# Altium footprint library MinervaBots.PcbLib: 162 footprints (part 5 of 11)
Each footprint in its own frame and in the unit in brackets; x right, y up, seen from the top. Pads: shape width x height; smd on the part's side, far side on the other; paste and mask are expansions set on the pad; w line width, h text height; cw(c..) or ccw(c..) is an arc to the next point about the centre after c.
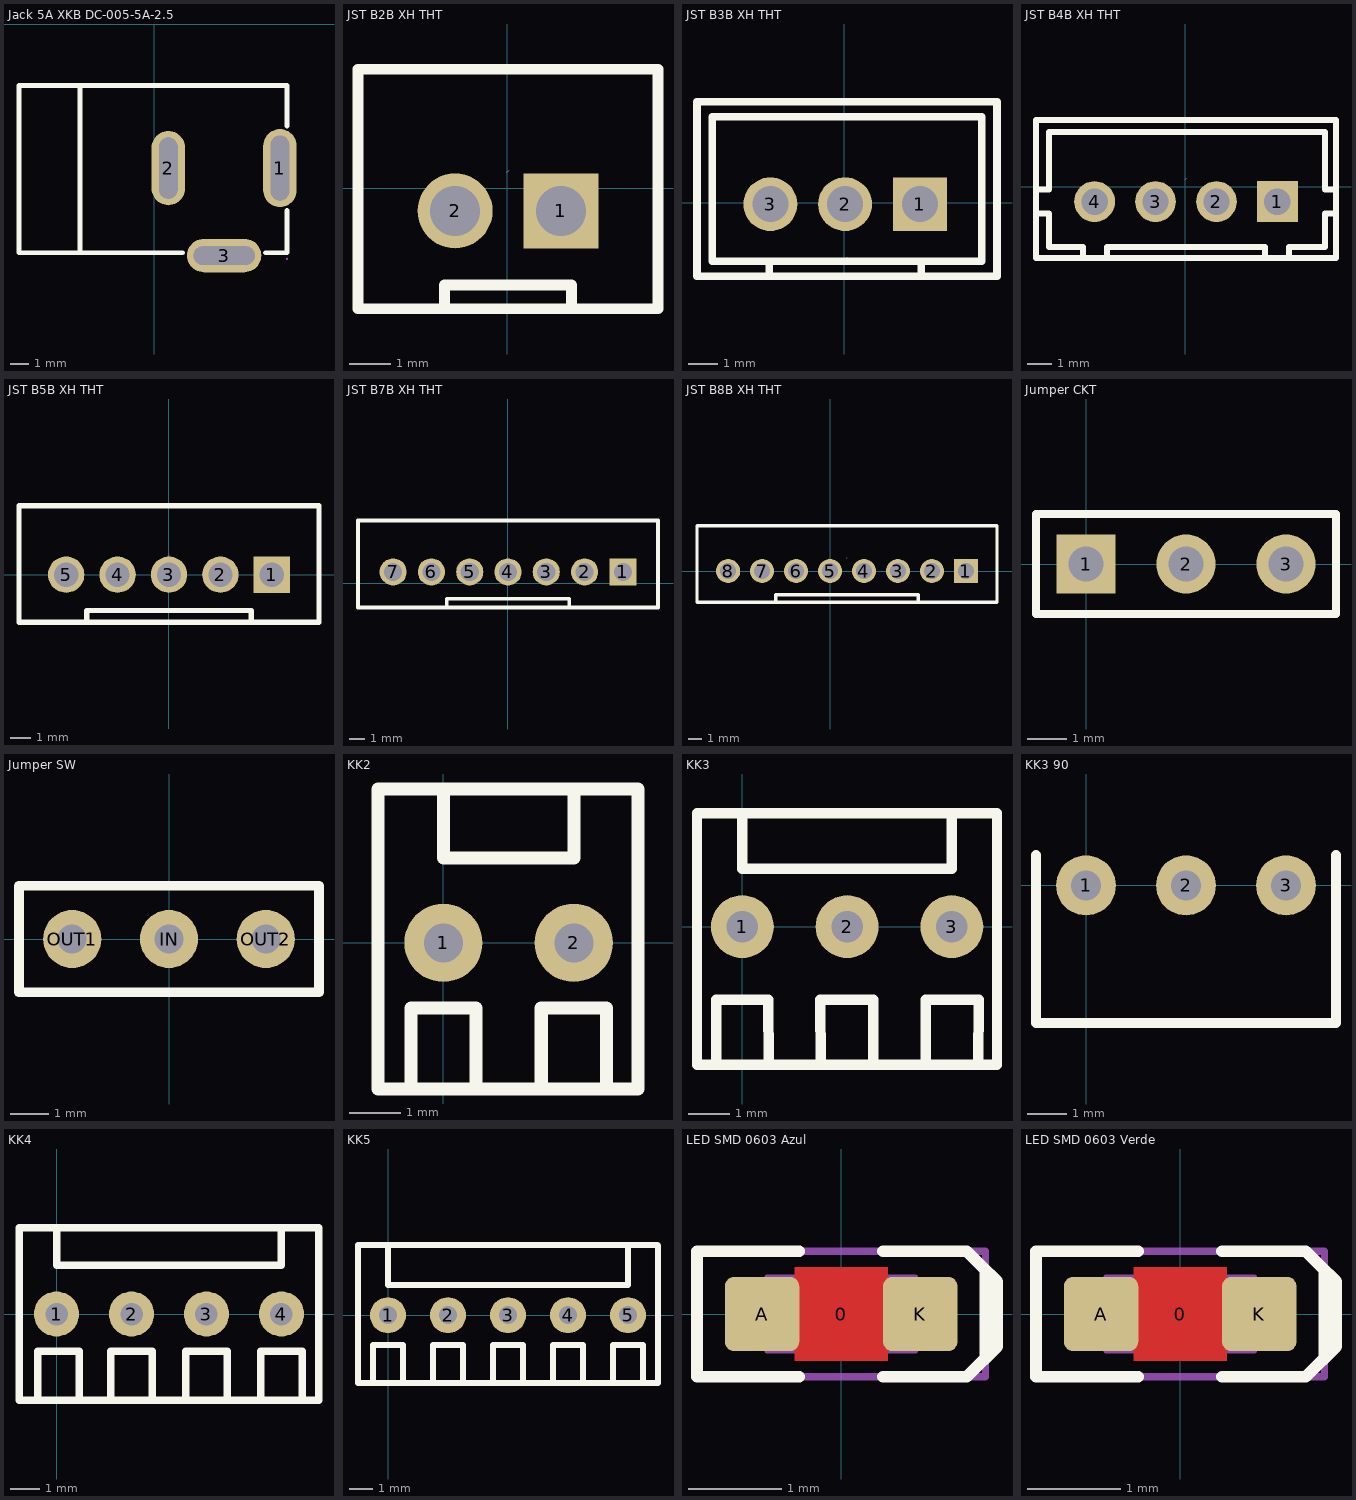
[diagram p4: the footprints below, top view; thin cyan lines are the x and y axes]

## Jack 5A XKB DC-005-5A-2.5 [mm] "Jack 5A XKB DC-005-5A-2.5"
pads (3):
  oval 1.8x4.2 hole 1 slot 3.5 at 90 deg: 1(6.764,-7.769)
  oval 1.8x4 hole 1 slot 3.3 at 90 deg: 2(0.764,-7.769)
  oval 4x1.8 hole 1 slot 3.3 at 0 deg: 3(3.763,-12.472)
Top Overlay:
  lines w0.254: -7.264,-3.324 7.144,-3.324 7.144,-5.504 ; -7.264,-3.316 -7.264,-12.316 1.543,-12.316 ; -3.984,-12.324 -3.984,-3.324 ; 5.984,-12.316 7.144,-12.316 7.144,-10.034
Top Designator:
  text ".Designator" at -7.431,-8.792 h1.52
Mechanical 5:
  region: 2.513,-12.297 5.013,-12.297 5.013,-12.647 2.513,-12.647
  region: 0.589,-9.019 0.589,-6.519 0.939,-6.519 0.939,-9.019
  region: 6.939,-6.269 6.939,-9.269 6.589,-9.269 6.589,-6.269
Mechanical 6:
  circle w0.06: c7.144,-12.648 r0.03
Mechanical 15:
  lines w0.003: 0.536,-8.082 0.587,-8.031
3D body "DCJ200-10-A-K1-K--3DModel-STEP-56544.STEP": height 11, standoff -3.5, extent -7.029,-12.645 7.271,-3.095

## JST B2B XH THT [mm] "JST Conector, 2 ways"
pads (2):
  rect 1.8x1.8 hole 1.2: 1(1.289,-0.546)
  round 1.8 hole 1.2: 2(-1.251,-0.546)
Top Overlay:
  lines w0.254: -1.505,-2.832 -1.505,-2.324 1.543,-2.324 1.543,-2.832 1.543,-2.578 ; -3.581,-2.896 -3.581,2.854 3.619,2.854 3.619,-2.896 -3.581,-2.896
Top Designator:
  text ".Designator" at -7.62,-0.528 h1.52
Mechanical 15:
  lines w0.003: -0.007,0.381 0.044,0.432
3D body "User Library-JST B2B-XH-A.step": height 7.1, standoff -3.3, extent -3.751,-2.931 3.649,2.819

## JST B3B XH THT [mm] "Jst conector, 3 ways"
pads (3):
  rect 1.8x1.8 hole 1.2: 1(2.526,-0.051)
  round 1.8 hole 1.2: 2(0.025,-0.051) 3(-2.474,-0.051)
Top Overlay:
  lines w0.254: -2.515,-2.464 -2.515,-2.083 ; 2.565,-2.464 2.565,-1.956 ; -4.928,-2.464 5.105,-2.464 5.105,3.378 -4.928,3.378 -4.928,-2.464 ; -4.42,-1.956 4.597,-1.956 4.597,2.87 -4.42,2.87 -4.42,-1.956
Top Designator:
  text ".Designator" at -7.529,-0.051 h1.52
Mechanical 15:
  lines w0.003: 0.064,-1.873 0.114,-1.822
3D body "User Library-jst-b3b-xh-a.step": height 7.1, standoff -3.3, extent -4.95,-2.367 4.95,3.383

## JST B4B XH THT [mm] "JST Conector, 4 ways"
pads (4):
  rect 1.7x1.7 hole 1.1: 1(3.837,-0.622)
  round 1.7 hole 1.1: 2(1.297,-0.622) 3(-1.243,-0.622) 4(-3.783,-0.622)
Top Overlay:
  lines w0.254: -6.173,-1.122 -5.673,-1.122 -5.673,-2.522 -4.273,-2.522 -4.273,-2.922 ; -6.173,-0.122 -5.673,-0.122 -5.673,2.278 5.827,2.278 5.827,-0.122 6.227,-0.122 ; -3.273,-2.922 -3.273,-2.522 3.327,-2.522 3.327,-2.922 ; 4.327,-2.922 4.327,-2.522 5.827,-2.522 5.827,-1.122 6.227,-1.122 ; -6.223,-2.972 6.277,-2.972 6.277,2.778 -6.223,2.778 -6.223,-2.972
Top Designator:
  text ".Designator" at -7.591,-0.605 h1.52
Mechanical 15:
  lines w0.003: 0.002,0.305 0.052,0.356
3D body "User Library-jst-b4b-xh-a-1.step": height 7.1, standoff -3.3, extent -6.225,-2.977 6.175,2.773

## JST B5B XH THT [mm] "JST conector, 5 ways"
pads (5):
  rect 1.8x1.8 hole 1.2: 1(5.08,0)
  round 1.8 hole 1.2: 2(2.54,0) 3(0,0) 4(-2.54,0) 5(-5.08,0)
Top Overlay:
  lines w0.254: -4.064,-2.286 -4.064,-1.778 4.064,-1.778 4.064,-2.286 ; -7.41,-2.35 7.41,-2.35 7.41,3.4 -7.41,3.4 -7.41,-2.35
Top Designator:
  text ".Designator" at -7.618,0.017 h1.52
Mechanical 15:
  lines w0.003: -0.025,0.927 0.025,0.978
3D body "User Library-jst-b4b-xh-a.step": height 7.1, standoff -3.3, extent -7.443,-2.424 7.457,3.326

## JST B7B XH THT [mm] "Jst conector, 7 ways"
pads (7):
  rect 1.8x1.8 hole 1.2: 1(7.639,0.75)
  round 1.8 hole 1.2: 2(5.099,0.75) 3(2.559,0.75) 4(0.019,0.75) 5(-2.521,0.75) 6(-5.061,0.75) 7(-7.601,0.75)
Top Overlay:
  lines w0.254: -4.045,-1.536 -4.045,-1.028 4.083,-1.028 4.083,-1.536 ; -9.931,-1.6 -9.931,4.15 9.969,4.15 9.969,-1.6 -9.931,-1.6
Top Designator:
  text ".Designator" at -7.599,0.767 h1.52
Mechanical 15:
  lines w0.003: -0.007,1.677 0.044,1.727
3D body "User Library-B7B-XH-A.step": height 7.2, standoff -3.2, extent -9.925,-1.61 9.975,4.14

## JST B8B XH THT [mm] "JST conector, 8 ways"
pads (8):
  rect 1.8x1.8 hole 1.2: 1(10.16,0)
  round 1.8 hole 1.2: 2(7.62,0) 3(5.08,0) 4(2.54,0) 5(0,0) 6(-2.54,0) 7(-5.08,0) 8(-7.62,0)
Top Overlay:
  lines w0.254: -4.064,-2.286 -4.064,-1.778 6.604,-1.778 6.604,-2.286 ; -9.95,-2.35 12.49,-2.35 12.49,3.4 -9.95,3.4 -9.95,-2.35
Top Designator:
  text ".Designator" at -6.348,0.017 h1.52
Mechanical 15:
  lines w0.003: 1.245,0.927 1.295,0.978
3D body "User Library-B8B-XH-A.STEP": height 7.1, standoff -3.3, extent -10.006,-2.397 12.394,3.353

## Jumper CKT [mm]
pads (3):
  rect 1.5x1.5 hole 0.9: 1(0,0)
  round 1.5 hole 0.9: 2(2.54,0) 3(5.08,0)
Top Overlay:
  lines w0.2: -1.27,-1.27 -1.27,1.27 6.35,1.27 6.35,-1.27 -1.27,-1.27
Top Designator:
  text ".Designator" at -5.078,-0.508 h1.52
3D body "Jumper.step": height 16.21, standoff 2.39, extent -1.2,-1.2 3.8,1.2
3D body "Header 3 pins - Male.stp": height 8.27, standoff -3.27, extent -1.27,-1.24 6.35,1.3

## Jumper SW [mil]
pads (3):
  round 60 hole 30: IN(0,0) OUT1(-100,0) OUT2(100,0)
Top Overlay:
  lines w10: -155,-55 155,-55 155,55 -155,55 -155,-55
Top Designator:
  text ".Designator" at -299.9,-19.99 h60
3D body "Jumper3.step": height 338.58, standoff -118.11, extent -152.36,-50 150,50

## KK2 [mil] "KK Conector, 2 ways"
pads (2):
  round 60 hole 30: 1(0,0) 2(100,0)
Top Overlay:
  lines w10: -25,-112 -25,-50 25,-50 25,-112 75,-112 75,-50 125,-50 125,-112 ; 0,118 0,65 100,65 100,118 ; -50,-112 149,-112 149,118 -50,118 -50,72 -50,-112
Top Designator:
  text ".Designator" at -250.4,-16.99 h60
3D body "KK2.STEP": height 467.5, standoff -132.5, extent -50,-116 150,114

## KK3 [mil] "KK connector, 3 ways"
pads (3):
  round 60 hole 30: 1(0,0) 2(100,0) 3(200,0)
Top Overlay:
  lines w10: -25,-131.89 -25,-69.88 24.54,-69.88 25,-131.89 ; 0,108.27 0,55.27 200,55.27 200,108.27 ; 74.8,-131.89 74.57,-69.88 124.8,-69.88 124.8,-131.89 ; 175,-131.89 175.23,-69.88 225.46,-69.88 225,-131.89 ; -43.31,-131.89 243.11,-131.89 243.11,108.27 -43.31,108.27 -43.31,-131.89
Top Designator:
  text ".Designator" at -200,-31.8 h60
3D body "22041031.STEP": height 462.6, standoff -131.89, extent -37.8,-125.98 237.8,102.36

## KK3 90 [mil] "KK connector, 3 ways, right-angle"
pads (3):
  round 60 hole 30: 1(0,0) 2(100,0) 3(200,0)
Top Overlay:
  lines w10: -50,30.51 -50,-137.6 250,-137.6 250,30.4
Top Designator:
  text ".Designator" at -199.9,107.52 h60
3D body "22051032.STEP": height 250.69, standoff -131.89, extent -37.8,-125.98 237.8,397.64

## KK4 [mil] "KK Conector, 4 ways"
pads (4):
  round 60 hole 30: 1(0,0) 2(100,0) 3(200,0) 4(300,0)
Top Overlay:
  lines w10: -25,-115 -25,-50 30,-50 30,-115 ; 0,110 0,65 300,65 300,115 ; 72.5,-115 72.5,-50 127.5,-50 127.5,-115 ; 172.5,-115 172.5,-50 227.5,-50 227.5,-115 ; 272.5,-115 272.5,-50 327.5,-50 327.5,-115 ; -50,-115 350,-115 350,115 -50,115 -50,-115
Top Designator:
  text ".Designator" at -149.9,-19.99 h60
3D body "KK4.STEP": height 467.5, standoff -132.5, extent -49.99,-116.99 350.01,113.01

## KK5 [mil] "KK Conector, 5 ways"
pads (5):
  round 60 hole 30: 1(0,0) 2(100,0) 3(200,0) 4(300,0) 5(400,0)
Top Overlay:
  lines w10: -25,-113 -25,-50 25,-50 25,-110 ; 75,-113 75,-50 125,-50 125,-110 ; 175,-113 175,-50 225,-50 225,-110 ; 275,-113 275,-50 325,-50 325,-110 ; 375,-113 375,-50 425,-50 425,-110 ; 400,117 400,50 0,50 0,75.25 ; 0,75.25 0,117 0,75.25 ; -50,-113 -50,117 449,117 450,116 450,-113 -50,-113
Top Designator:
  text ".Designator" at -99.9,-17.99 h60
3D body "KK5.STEP": height 467.5, standoff -132.5, extent -50,-117 450,113

## LED SMD 0603 Azul [mm]
height 0.8
pads (3):
  round 0.254 on Mech15: 0(0,0)
  rrect25% 0.8x0.8 smd: A(-0.85,0) K(0.85,0)
Top Layer:
  pour cut-out: -0.5,0.5 0.5,0.5 0.5,-0.5 -0.5,-0.5
Top Overlay:
  lines w0.127: -0.45,-0.675 -1.55,-0.675 -1.55,0.675 -0.45,0.675 ; 0.45,-0.675 1.35,-0.675 1.55,-0.475 1.55,0.475 1.35,0.675 0.45,0.675 ; 1.5,0.525 1.675,0.35 1.675,-0.35 1.525,-0.5
Top Designator:
  text ".Designator" at -7.555,-0.508 h1.52
Mechanical 13:
  lines w0.05: -0.6,-0.4 -0.6,0.399 0.6,0.4 0.6,-0.4 -0.6,-0.399 ; -0.505,-0.398 -0.505,0.398 ; -0.5,-0.4 -0.8,-0.4 -0.8,0.4 -0.5,0.4 ; 0.5,-0.4 0.8,-0.4 0.8,0.4 0.5,0.4 ; 0.505,-0.398 0.505,0.398 ; -0.599,-0.398 0.599,-0.398 0.599,0.398 -0.599,0.398 -0.599,-0.398
Mechanical 15:
  lines w0.076: -1.55,-0.675 -1.55,0.675 1.55,0.675 1.55,-0.675 -1.55,-0.675
3D body "LED Azul.STEP": height 0.76, standoff 0.01, extent -0.8,-0.4 0.8,0.4

## LED SMD 0603 Verde [mm]
height 0.8
pads (3):
  round 0.254 on Mech15: 0(0,0)
  rrect25% 0.8x0.8 smd: A(-0.85,0) K(0.85,0)
Top Layer:
  pour cut-out: -0.5,0.5 0.5,0.5 0.5,-0.5 -0.5,-0.5
Top Overlay:
  lines w0.127: -0.45,-0.675 -1.55,-0.675 -1.55,0.675 -0.45,0.675 ; 0.45,-0.675 1.35,-0.675 1.55,-0.475 1.55,0.475 1.35,0.675 0.45,0.675 ; 1.5,0.525 1.675,0.35 1.675,-0.35 1.525,-0.5
Top Designator:
  text ".Designator" at -7.555,-0.508 h1.52
Mechanical 13:
  lines w0.05: -0.6,-0.4 -0.6,0.399 0.6,0.4 0.6,-0.4 -0.6,-0.399 ; -0.505,-0.398 -0.505,0.398 ; -0.5,-0.4 -0.8,-0.4 -0.8,0.4 -0.5,0.4 ; 0.5,-0.4 0.8,-0.4 0.8,0.4 0.5,0.4 ; 0.505,-0.398 0.505,0.398 ; -0.599,-0.398 0.599,-0.398 0.599,0.398 -0.599,0.398 -0.599,-0.398
Mechanical 15:
  lines w0.076: -1.55,-0.675 -1.55,0.675 1.55,0.675 1.55,-0.675 -1.55,-0.675
3D body "LED Verde.STEP": height 0.76, standoff 0.01, extent -0.8,-0.4 0.8,0.4